# Altium footprint library MinervaBots.PcbLib: 162 footprints (part 1 of 11)
Each footprint in its own frame and in the unit in brackets; x right, y up, seen from the top. Pads: shape width x height; smd on the part's side, far side on the other; paste and mask are expansions set on the pad; w line width, h text height; cw(c..) or ccw(c..) is an arc to the next point about the centre after c.
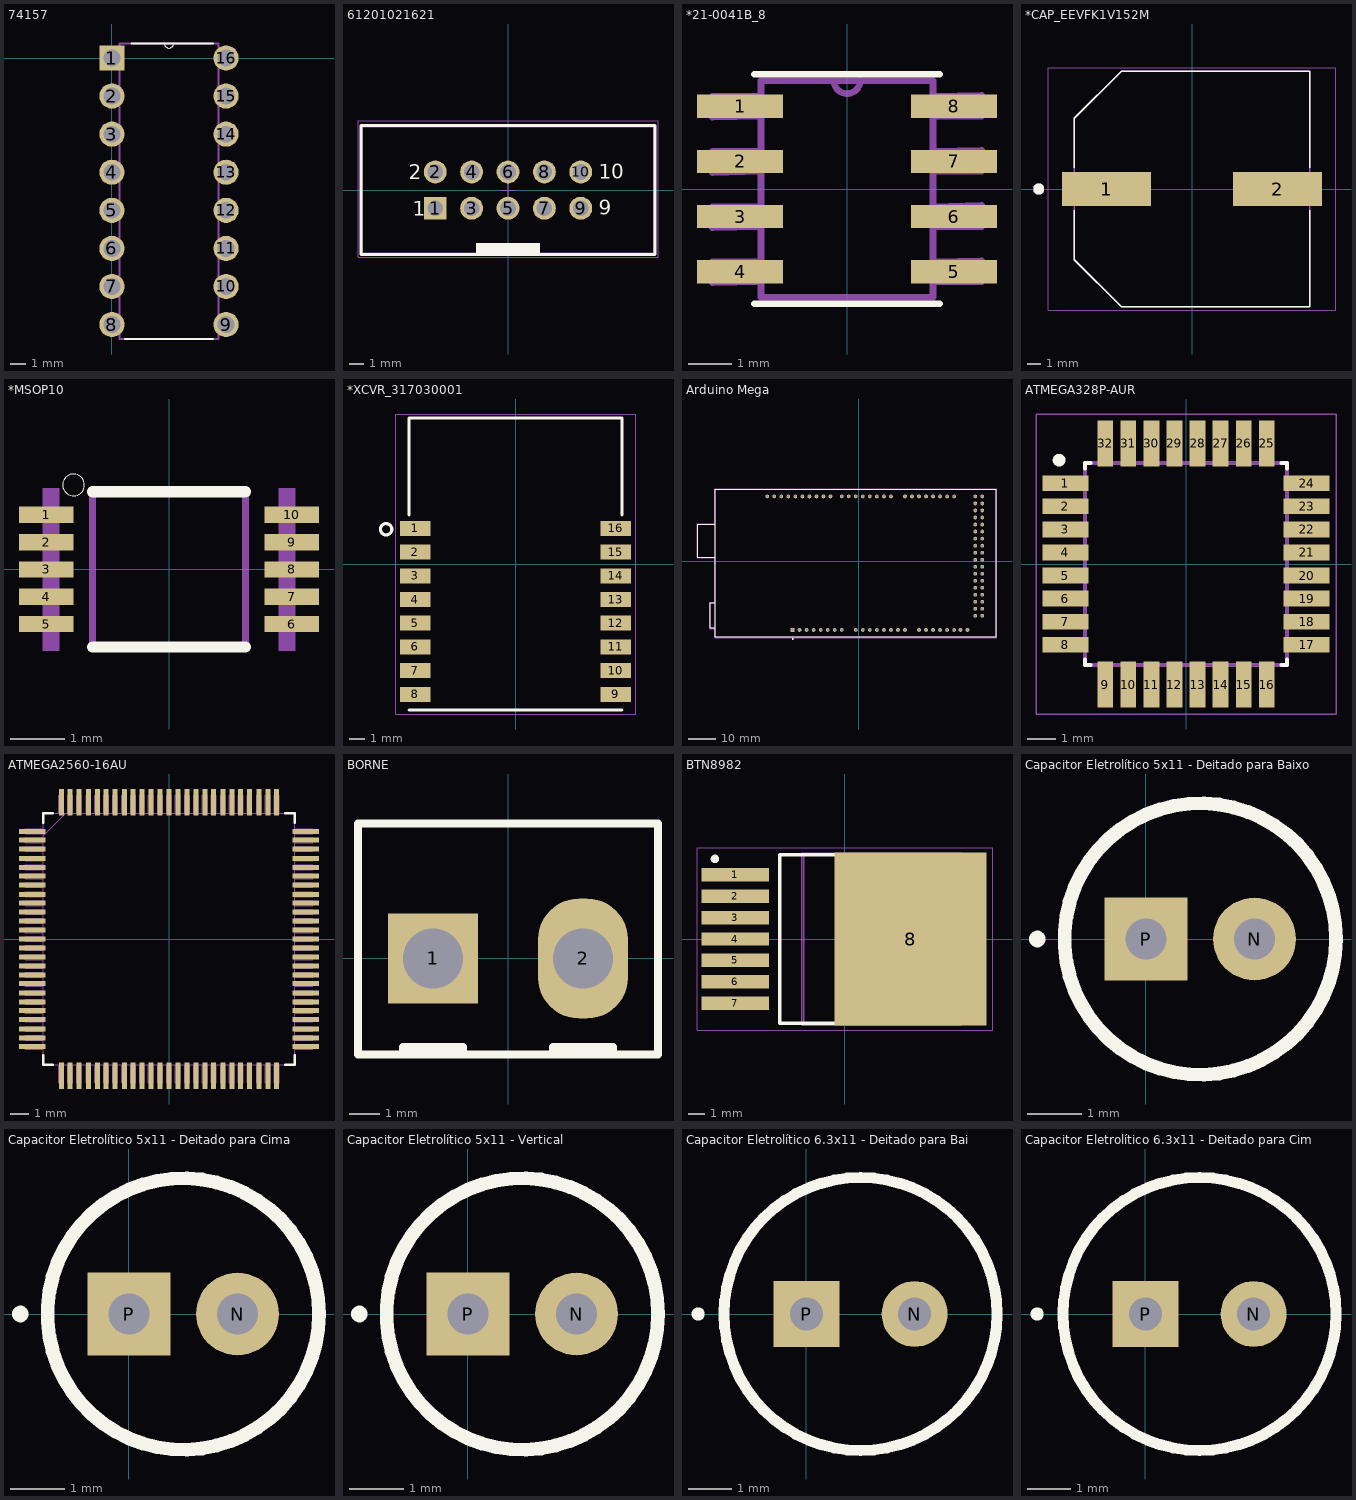
[diagram p0: the footprints below, top view; thin cyan lines are the x and y axes]

## 74157 [mil]
pads (16):
  rect 66x66 hole 44: 1(0,0)
  round 66 hole 44: 2(0,-100) 3(0,-200) 4(0,-300) 5(0,-400) 6(0,-500) 7(0,-600) 8(0,-700) 9(300,-700) 10(300,-600) 11(300,-500) 12(300,-400) 13(300,-300) 14(300,-200) 15(300,-100) 16(300,0)
Top Overlay:
  lines w0: 138,38 ccw(c150,38) 162,38
  lines w6: 35,-738 265,-738 ; 52,38 138,38 162,38 265,38
Top Designator:
  text ".Designator" at -149.9,-374.99 h60
Mechanical 4:
  lines w0: 138,38 ccw(c150,38) 162,38 cw(c150,38) 138,38
  lines w6: -22,-722 20,-722 ; -22,-722 -22,-678 ; -22,-722 20,-722 ; -22,-722 -22,-678 ; -22,-678 20,-678 ; -22,-678 20,-678 ; -22,-622 20,-622 ; -22,-622 -22,-578 ; -22,-622 20,-622 ; -22,-622 -22,-578 ; -22,-578 20,-578 ; -22,-578 20,-578 ; -22,-522 20,-522 ; -22,-522 -22,-478 ; -22,-522 20,-522 ; -22,-522 -22,-478 ; -22,-478 20,-478 ; -22,-478 20,-478 ; -22,-422 20,-422 ; -22,-422 -22,-378 ; -22,-422 20,-422 ; -22,-422 -22,-378 ; -22,-378 20,-378 ; -22,-378 20,-378 ; -22,-322 20,-322 ; -22,-322 -22,-278 ; -22,-322 20,-322 ; -22,-322 -22,-278 ; -22,-278 20,-278 ; -22,-278 20,-278 ; -22,-222 20,-222 ; -22,-222 -22,-178 ; -22,-222 20,-222 ; -22,-222 -22,-178 ; -22,-178 20,-178 ; -22,-178 20,-178 ; -22,-122 20,-122 ; -22,-122 -22,-78 ; -22,-122 20,-122 ; -22,-122 -22,-78 ; -22,-78 20,-78 ; -22,-78 20,-78 ; -22,-22 20,-22 ; -22,-22 -22,22 ; -22,-22 20,-22 ; -22,-22 -22,22 ; -22,22 20,22 ; -22,22 20,22 ; 20,-738 20,38 ; 20,-738 280,-738 ; 20,-738 20,38 ; 20,-738 280,-738 ; 20,-722 20,-678 ; 20,-722 20,-678 ; 20,-622 20,-578 ; 20,-622 20,-578 ; 20,-522 20,-478 ; 20,-522 20,-478 ; 20,-422 20,-378 ; 20,-422 20,-378 ; 20,-322 20,-278 ; 20,-322 20,-278 ; 20,-222 20,-178 ; 20,-222 20,-178 ; 20,-122 20,-78 ; 20,-122 20,-78 ; 20,-22 20,22 ; 20,-22 20,22 ; 20,38 138,38 ; 20,38 138,38 ; 138,38 162,38 ; 138,38 162,38 ; 162,38 280,38 ; 162,38 280,38 ; 280,-738 280,38 ; 280,-738 280,38 ; 280,-722 322,-722 ; 280,-722 280,-678 ; 280,-722 322,-722 ; 280,-722 280,-678 ; 280,-678 322,-678 ; 280,-678 322,-678 ; 280,-622 322,-622 ; 280,-622 280,-578 ; 280,-622 322,-622 ; 280,-622 280,-578 ; 280,-578 322,-578 ; 280,-578 322,-578 ; 280,-522 322,-522 ; 280,-522 280,-478 ; 280,-522 322,-522 ; 280,-522 280,-478 ; 280,-478 322,-478 ; 280,-478 322,-478 ; 280,-422 322,-422 ; 280,-422 280,-378 ; 280,-422 322,-422 ; 280,-422 280,-378 ; 280,-378 322,-378 ; 280,-378 322,-378 ; 280,-322 322,-322 ; 280,-322 280,-278 ; 280,-322 322,-322 ; 280,-322 280,-278 ; 280,-278 322,-278 ; 280,-278 322,-278 ; 280,-222 322,-222 ; 280,-222 280,-178 ; 280,-222 322,-222 ; 280,-222 280,-178 ; 280,-178 322,-178 ; 280,-178 322,-178 ; 280,-122 322,-122 ; 280,-122 280,-78 ; 280,-122 322,-122 ; 280,-122 280,-78 ; 280,-78 322,-78 ; 280,-78 322,-78 ; 280,-22 322,-22 ; 280,-22 280,22 ; 280,-22 322,-22 ; 280,-22 280,22 ; 280,22 322,22 ; 280,22 322,22 ; 322,-722 322,-678 ; 322,-722 322,-678 ; 322,-622 322,-578 ; 322,-622 322,-578 ; 322,-522 322,-478 ; 322,-522 322,-478 ; 322,-422 322,-378 ; 322,-422 322,-378 ; 322,-322 322,-278 ; 322,-322 322,-278 ; 322,-222 322,-178 ; 322,-222 322,-178 ; 322,-122 322,-78 ; 322,-122 322,-78 ; 322,-22 322,22 ; 322,-22 322,22
3D body "74157.step": height 165, standoff -101, extent 0,-780 310,70

## 61201021621 [mm] "10 pins, straight, gold plating"
height 9.1
pads (10):
  rect 1.6x1.6 hole 1.1: 1(-5.08,-1.27)
  round 1.6 hole 1.1: 2(-5.08,1.27) 3(-2.54,-1.27) 4(-2.54,1.27) 5(0,-1.27) 6(0,1.27) 7(2.54,-1.27) 8(2.54,1.27) 9(5.08,-1.27) 10(5.08,1.27)
Top Overlay:
  rectangle: -2.25,-4.5 2.25,-3.7
  lines w0.2: -10.28,-4.5 -10.28,4.5 10.28,4.5 10.28,-4.5 -10.28,-4.5
  text "9" at 6.34,-1.74 h1.02
  text "10" at 6.34,0.8 h1.02
  text "2" at -6.94,0.74 h1.02
  text "1" at -6.64,-1.8 h1.02
Top Designator:
  text ".Designator" at -7.618,-0.433 h1.52
Mechanical 13:
  rectangle: -2.25,-4.425 2.25,-3.7
  lines w0.1: -10.18,-4.425 10.18,-4.425 10.18,4.425 -10.18,4.425 -10.18,-4.425
Mechanical 15:
  lines w0.05: -0.5,0 0.5,0 ; 0,-0.5 0,0.5 ; -10.48,-4.7 -10.48,4.85 10.48,4.85 10.48,-4.7 -10.48,-4.7
3D body "61201021621.stp": height 9.13, standoff -2.98, extent -10.18,-4.425 10.18,4.75

## *21-0041B_8 [mil]
pads (8):
  rect 78x21 smd: 1(-97,75) 2(-97,25) 3(-97,-25) 4(-97,-75) 5(97,-75) 6(97,-25) 7(97,25) 8(97,75)
Top Overlay:
  lines w6: -84,-104 84,-104 ; -84,104 84,104
Top Designator:
  text ".Designator" at -299.9,-19.99 h60
Mechanical 4:
  lines w6: -122,-85 -122,-66 ; -122,-85 -78,-84 ; -122,-85 -122,-66 ; -122,-85 -78,-84 ; -122,-66 -78,-66 ; -122,-66 -78,-66 ; -122,-35 -122,-16 ; -122,-35 -78,-34 ; -122,-35 -122,-16 ; -122,-35 -78,-34 ; -122,-16 -78,-16 ; -122,-16 -78,-16 ; -122,15 -122,34 ; -122,15 -78,16 ; -122,15 -122,34 ; -122,15 -78,16 ; -122,34 -78,34 ; -122,34 -78,34 ; -122,65 -122,84 ; -122,65 -78,66 ; -122,65 -122,84 ; -122,65 -78,66 ; -122,84 -78,84 ; -122,84 -78,84 ; -78,-98 78,-98 ; -78,-98 -78,98 ; -78,-98 78,-98 ; -78,-98 -78,98 ; -78,-84 -78,-66 ; -78,-84 -78,-66 ; -78,-34 -78,-16 ; -78,-34 -78,-16 ; -78,16 -78,34 ; -78,16 -78,34 ; -78,66 -78,84 ; -78,66 -78,84 ; -78,98 -12,98 ; -78,98 -12,98 ; -12,98 78,98 ; -12,98 78,98 ; 78,-98 78,98 ; 78,-98 78,98 ; 78,-84 78,-66 ; 78,-84 122,-84 ; 78,-84 78,-66 ; 78,-84 122,-84 ; 78,-66 122,-65 ; 78,-66 122,-65 ; 78,-34 78,-16 ; 78,-34 122,-34 ; 78,-34 78,-16 ; 78,-34 122,-34 ; 78,-16 122,-15 ; 78,-16 122,-15 ; 78,16 78,34 ; 78,16 122,16 ; 78,16 78,34 ; 78,16 122,16 ; 78,34 122,35 ; 78,34 122,35 ; 78,66 78,84 ; 78,66 122,66 ; 78,66 78,84 ; 78,66 122,66 ; 78,84 122,85 ; 78,84 122,85 ; 122,-84 122,-65 ; 122,-84 122,-65 ; 122,-34 122,-15 ; 122,-34 122,-15 ; 122,16 122,35 ; 122,16 122,35 ; 122,66 122,85 ; 122,66 122,85 ; -12,98.08 ccw(c0,98.5) 12,98.92 cw(c0,98.5) -12,98.08

## *CAP_EEVFK1V152M [mm]
pads (2):
  rect 6.5x2.5 smd: 1(-6.25,0) 2(6.25,0)
Top Overlay:
  circle w0.4: c-11.2,0 r0.2
  lines w0.127: -8.6,-1.57 -8.6,-5.16 -5.16,-8.6 8.6,-8.6 8.6,-1.57 ; -8.6,1.57 -8.6,5.16 -5.16,8.6 8.6,8.6 8.6,1.57
Top Designator:
  text ".Designator" at -8.15,-0.508 h1.52
Mechanical 4:
  circle w0.4: c-11.2,0 r0.2
  circle w0.4: c-11.2,0 r0.2
  lines w0.127: -8.6,-5.16 -8.6,5.16 ; -8.6,-5.16 -5.16,-8.6 ; -8.6,-5.16 -8.6,5.16 ; -8.6,-5.16 -5.16,-8.6 ; -8.6,5.16 -5.16,8.6 ; -8.6,5.16 -5.16,8.6 ; -5.16,-8.6 8.6,-8.6 ; -5.16,-8.6 8.6,-8.6 ; -5.16,8.6 8.6,8.6 ; -5.16,8.6 8.6,8.6 ; 8.6,-8.6 8.6,8.6 ; 8.6,-8.6 8.6,8.6
Mechanical 16:
  lines w0.05: -10.51,-8.85 10.51,-8.85 10.51,8.85 -10.51,8.85 -10.51,-8.85
3D body "User Library-E-CAP 1500UF_SUNCON.step": height 17.2, standoff 0, extent -8.65,-8.15 8.65,8.15

## *MSOP10 [mm]
pads (10):
  rect 1x0.3 smd: 1(-2.25,1) 2(-2.25,0.5) 3(-2.25,0) 4(-2.25,-0.5) 5(-2.25,-1) 6(2.25,-1) 7(2.25,-0.5) 8(2.25,0) 9(2.25,0.5) 10(2.25,1)
Top Overlay:
  circle w0: c-1.75,1.55 r0.2
  lines w0.203: -1.4,-1.425 1.4,-1.425 ; -1.4,1.425 1.4,1.425
Top Paste:
  region: 2.137,1.438 2.388,1.438 2.388,0.563 2.137,0.563
  region: 2.137,0.937 2.388,0.937 2.388,0.062 2.137,0.062
  region: 2.137,0.437 2.388,0.437 2.388,-0.437 2.137,-0.437
  region: 2.137,-0.062 2.388,-0.062 2.388,-0.937 2.137,-0.937
  region: 2.137,-0.563 2.388,-0.563 2.388,-1.438 2.137,-1.438
  region: -2.388,-0.563 -2.137,-0.563 -2.137,-1.438 -2.388,-1.438
  region: -2.388,-0.062 -2.137,-0.062 -2.137,-0.937 -2.388,-0.937
  region: -2.388,0.437 -2.137,0.437 -2.137,-0.437 -2.388,-0.437
  region: -2.388,0.937 -2.137,0.937 -2.137,0.062 -2.388,0.062
  region: -2.388,1.438 -2.137,1.438 -2.137,0.563 -2.388,0.563
Top Solder:
  region: 2.05,1.55 2.45,1.55 2.45,0.45 2.05,0.45
  region: 2.05,1.05 2.45,1.05 2.45,-0.05 2.05,-0.05
  region: 2.05,0.55 2.45,0.55 2.45,-0.55 2.05,-0.55
  region: 2.05,0.05 2.45,0.05 2.45,-1.05 2.05,-1.05
  region: 2.05,-0.45 2.45,-0.45 2.45,-1.55 2.05,-1.55
  region: -2.45,-0.45 -2.05,-0.45 -2.05,-1.55 -2.45,-1.55
  region: -2.45,0.05 -2.05,0.05 -2.05,-1.05 -2.45,-1.05
  region: -2.45,0.55 -2.05,0.55 -2.05,-0.55 -2.45,-0.55
  region: -2.45,1.05 -2.05,1.05 -2.05,-0.05 -2.45,-0.05
  region: -2.45,1.55 -2.05,1.55 -2.05,0.45 -2.45,0.45
Top Designator:
  text ".Designator" at -7.618,-0.408 h1.52
Mechanical 4:
  region: 2.013,1.488 2.312,1.488 2.312,0.513 2.013,0.513
  region: 2.013,0.988 2.312,0.988 2.312,0.012 2.013,0.012
  region: 2.013,0.487 2.312,0.487 2.312,-0.487 2.013,-0.487
  region: 2.013,-0.012 2.312,-0.012 2.312,-0.988 2.013,-0.988
  region: 2.013,-0.513 2.312,-0.513 2.312,-1.488 2.013,-1.488
  region: -2.312,-0.513 -2.013,-0.513 -2.013,-1.488 -2.312,-1.488
  region: -2.312,-0.012 -2.013,-0.012 -2.013,-0.988 -2.312,-0.988
  region: -2.312,0.487 -2.013,0.487 -2.013,-0.487 -2.312,-0.487
  region: -2.312,0.988 -2.013,0.988 -2.013,0.012 -2.312,0.012
  region: -2.312,1.488 -2.013,1.488 -2.013,0.513 -2.312,0.513
  region: 2.013,1.488 2.312,1.488 2.312,0.513 2.013,0.513
  region: 2.013,0.988 2.312,0.988 2.312,0.012 2.013,0.012
  region: 2.013,0.487 2.312,0.487 2.312,-0.487 2.013,-0.487
  region: 2.013,-0.012 2.312,-0.012 2.312,-0.988 2.013,-0.988
  region: 2.013,-0.513 2.312,-0.513 2.312,-1.488 2.013,-1.488
  region: -2.312,-0.513 -2.013,-0.513 -2.013,-1.488 -2.312,-1.488
  region: -2.312,-0.012 -2.013,-0.012 -2.013,-0.988 -2.312,-0.988
  region: -2.312,0.487 -2.013,0.487 -2.013,-0.487 -2.312,-0.487
  region: -2.312,0.988 -2.013,0.988 -2.013,0.012 -2.312,0.012
  region: -2.312,1.488 -2.013,1.488 -2.013,0.513 -2.312,0.513
  lines w0.127: -1.4,-1.425 -1.4,1.425 -1.4,-1.425 ; 1.4,-1.425 1.4,1.425 1.4,-1.425

## *XCVR_317030001 [mm]
pads (16):
  rect 1.95x0.95 smd: 1(-6.35,2.25) 2(-6.35,0.75) 3(-6.35,-0.75) 4(-6.35,-2.25) 5(-6.35,-3.75) 6(-6.35,-5.25) 7(-6.35,-6.75) 8(-6.35,-8.25) 9(6.35,-8.25) 10(6.35,-6.75) 11(6.35,-5.25) 12(6.35,-3.75) 13(6.35,-2.25) 14(6.35,-0.75) 15(6.35,0.75) 16(6.35,2.25)
Top Overlay:
  circle w0.2: c-8.2,2.2 r0.361
  lines w0.2: -6.75,-9.25 6.75,-9.25 ; -6.75,3.1 -6.75,9.25 6.75,9.25 6.75,3.1
Top Designator:
  text ".Designator" at -8.135,-0.508 h1.52
Mechanical 16:
  lines w0.05: -7.6,-9.5 7.6,-9.5 7.6,9.5 -7.6,9.5 -7.6,-9.5
3D body "HM11.stp": height 1.7, standoff -0.1, extent -6.75,-9.144 6.75,9.356

## Arduino Mega [mm]
pads (92):
  round 1.358 hole 0.85: 0(11.666,23.458) 1(9.126,23.458) 2(6.586,23.458) 3(4.046,23.458) 3V3(-16.274,-24.802) 4(1.506,23.458) 5(-1.034,23.458) 5V_1(-13.734,-24.802) 5V_2(42.146,23.458) 5V_3(44.686,23.458) 6(-3.574,23.458) 7(-6.114,23.458) 8(-10.178,23.458) 9(-12.718,23.458) 10(-15.258,23.458) 11(-17.798,23.458) 12(-20.338,23.458) 13(-22.878,23.458) 14(16.746,23.458) 15(19.286,23.458) 16(21.826,23.458) 17(24.366,23.458) 18(26.906,23.458) 19(29.446,23.458) 20(31.986,23.458) 21(34.526,23.458) 22(42.146,20.918) 23(44.686,20.918) 24(42.146,18.378) 25(44.686,18.378) 26(42.146,15.838) 27(44.686,15.838) 28(42.146,13.298) 29(44.686,13.298) 30(42.146,10.758) 31(44.686,10.758) 32(42.146,8.218) 33(44.686,8.218) 34(42.146,5.678) 35(44.686,5.678) 36(42.146,3.138) 37(44.686,3.138) 38(42.146,0.598) 39(44.686,0.598) 40(42.146,-1.942) 41(44.686,-1.942) 42(42.146,-4.482) 43(44.686,-4.482) 44(42.146,-7.022) 45(44.686,-7.022) 46(42.146,-9.562) 47(44.686,-9.562) 48(42.146,-12.102) 49(44.686,-12.102) 50(42.146,-14.642) 51(44.686,-14.642) 52(42.146,-17.182) 53(44.686,-17.182) AD0(-1.034,-24.802) AD1(1.506,-24.802) AD2(4.046,-24.802) AD3(6.586,-24.802) AD4(9.126,-24.802) AD5(11.666,-24.802) AD6(14.206,-24.802) AD7(16.746,-24.802) AD8(21.826,-24.802) AD9(24.366,-24.802) AD10(26.906,-24.802) AD11(29.446,-24.802) AD12(31.986,-24.802) AD13(34.526,-24.802) AD14(36.812,-24.802) AD15(39.352,-24.802) AREF(-27.958,23.458) GND1(-11.194,-24.802) GND2(-8.654,-24.802) GND3(-25.418,23.458) GND4(42.146,-19.722) GND5(44.686,-19.722) IOREF(-21.354,-24.802) RESET(-18.814,-24.802) SCL(-33.038,23.458) SDA(-30.498,23.458) VIN(-6.114,-24.802)
  rect 1.358x1.358 hole 0.85: NC(-23.894,-24.802)
  round 0 all layers, no hole: None(-37.864,-24.802) None(-36.594,23.458) None(14.206,-19.722) None(14.206,8.218) None(38.336,23.458) None(44.686,-24.802)
Top Overlay:
  circle w0.24: c-23.844,-28.072 r0.12
  lines w0.127: -51.834,-24.042 -53.644,-24.042 -53.644,-15.05 -51.834,-15.05 ; -51.834,-24.042 -51.834,-15.05 ; -51.834,-24.042 -51.834,-27.342 49.766,-27.342 49.766,25.998 -51.834,25.998 -51.834,13.348 ; -51.834,-15.05 -51.834,1.548 ; -51.834,1.548 -58.184,1.548 -58.184,13.348 -51.834,13.348 ; -51.834,1.548 -51.834,13.348
Top Designator:
  text ".Designator" at -11.827,-1.528 h1.52
Mechanical 4:
  circle w0.24: c-23.844,-28.072 r0.12
  circle w0.24: c-23.844,-28.072 r0.12
  lines w0.127: -58.184,1.548 -51.834,1.548 ; -58.184,1.548 -58.184,13.348 ; -58.184,1.548 -51.834,1.548 ; -58.184,1.548 -58.184,13.348 ; -58.184,13.348 -51.834,13.348 ; -58.184,13.348 -51.834,13.348 ; -53.644,-24.042 -53.644,-15.05 ; -53.644,-24.042 -51.834,-24.042 ; -53.644,-24.042 -53.644,-15.05 ; -53.644,-24.042 -51.834,-24.042 ; -53.644,-15.05 -51.834,-15.05 ; -53.644,-15.05 -51.834,-15.05 ; -51.834,-27.342 49.766,-27.342 ; -51.834,-27.342 -51.834,-24.042 ; -51.834,-27.342 49.766,-27.342 ; -51.834,-27.342 -51.834,-24.042 ; -51.834,-24.042 -51.834,-15.05 ; -51.834,-24.042 -51.834,-15.05 ; -51.834,-15.05 -51.834,1.548 ; -51.834,-15.05 -51.834,1.548 ; -51.834,1.548 -51.834,13.348 ; -51.834,1.548 -51.834,13.348 ; -51.834,13.348 -51.834,25.998 ; -51.834,13.348 -51.834,25.998 ; -51.834,25.998 49.766,25.998 ; -51.834,25.998 49.766,25.998 ; 49.766,-27.342 49.766,25.998 ; 49.766,-27.342 49.766,25.998
Mechanical 16:
  lines w0.05: -58.434,1.298 -58.434,13.598 -52.084,13.598 -52.084,26.248 50.016,26.248 50.016,-27.592 -52.084,-27.592 -52.084,-24.292 -53.894,-24.292 -53.894,-14.8 -52.084,-14.8 -52.084,1.298 -58.434,1.298
3D body "Arduino MEGA 2650.STEP": height -0.95, standoff -16.2, extent -58.42,-27.305 49.53,26.035

## ATMEGA328P-AUR [mm]
pads (32):
  rect 1.6x0.55 smd: 1(-4.18,2.8) 2(-4.18,2) 3(-4.18,1.2) 4(-4.18,0.4) 5(-4.18,-0.4) 6(-4.18,-1.2) 7(-4.18,-2) 8(-4.18,-2.8) 17(4.18,-2.8) 18(4.18,-2) 19(4.18,-1.2) 20(4.18,-0.4) 21(4.18,0.4) 22(4.18,1.2) 23(4.18,2) 24(4.18,2.8)
  rect 0.55x1.6 smd: 9(-2.8,-4.18) 10(-2,-4.18) 11(-1.2,-4.18) 12(-0.4,-4.18) 13(0.4,-4.18) 14(1.2,-4.18) 15(2,-4.18) 16(2.8,-4.18) 25(2.8,4.18) 26(2,4.18) 27(1.2,4.18) 28(0.4,4.18) 29(-0.4,4.18) 30(-1.2,4.18) 31(-2,4.18) 32(-2.8,4.18)
Top Overlay:
  circle w0.24: c-4.4,3.6 r0.1
  lines w0.127: -3.5,-3.3 -3.5,-3.5 -3.3,-3.5 ; -3.5,3.3 -3.5,3.5 -3.3,3.5 ; 3.3,-3.5 3.5,-3.5 3.5,-3.3 ; 3.3,3.5 3.5,3.5 3.5,3.3
Top Designator:
  text ".Designator" at -7.618,-0.508 h1.52
Mechanical 4:
  lines w0.127: -3.5,-3.5 -3.5,3.5 ; -3.5,-3.5 3.5,-3.5 ; -3.5,-3.5 -3.5,3.5 ; -3.5,-3.5 3.5,-3.5 ; -3.5,3.5 3.5,3.5 ; -3.5,3.5 3.5,3.5 ; 3.5,-3.5 3.5,3.5 ; 3.5,-3.5 3.5,3.5
Mechanical 16:
  lines w0.05: -5.2,-5.2 -5.2,5.2 5.2,5.2 5.2,-5.2 -5.2,-5.2
3D body "ATmega_AP214.STEP": height 1, standoff -0.1, extent -4.498,-4.498 4.498,4.498

## ATMEGA2560-16AU [mil]
pads (100):
  rect 58x11 smd: 1(-300,236) 2(-300,217) 3(-300,197) 4(-300,177) 5(-300,157) 6(-300,138) 7(-300,118) 8(-300,98) 9(-300,79) 10(-300,59) 11(-300,39) 12(-300,20) 13(-300,0) 14(-300,-20) 15(-300,-39) 16(-300,-59) 17(-300,-79) 18(-300,-98) 19(-300,-118) 20(-300,-138) 21(-300,-157) 22(-300,-177) 23(-300,-197) 24(-300,-217) 25(-300,-236) 51(300,-236) 52(300,-217) 53(300,-197) 54(300,-177) 55(300,-157) 56(300,-138) 57(300,-118) 58(300,-98) 59(300,-79) 60(300,-59) 61(300,-39) 62(300,-20) 63(300,0) 64(300,20) 65(300,39) 66(300,59) 67(300,79) 68(300,98) 69(300,118) 70(300,138) 71(300,157) 72(300,177) 73(300,197) 74(300,217) 75(300,236)
  rect 11x58 smd: 26(-236,-300) 27(-217,-300) 28(-197,-300) 29(-177,-300) 30(-157,-300) 31(-138,-300) 32(-118,-300) 33(-98,-300) 34(-79,-300) 35(-59,-300) 36(-39,-300) 37(-20,-300) 38(0,-300) 39(20,-300) 40(39,-300) 41(59,-300) 42(79,-300) 43(98,-300) 44(118,-300) 45(138,-300) 46(157,-300) 47(177,-300) 48(197,-300) 49(217,-300) 50(236,-300) 76(236,300) 77(217,300) 78(197,300) 79(177,300) 80(157,300) 81(138,300) 82(118,300) 83(98,300) 84(79,300) 85(59,300) 86(39,300) 87(20,300) 88(0,300) 89(-20,300) 90(-39,300) 91(-59,300) 92(-79,300) 93(-98,300) 94(-118,300) 95(-138,300) 96(-157,300) 97(-177,300) 98(-197,300) 99(-217,300) 100(-236,300)
Top Overlay:
  lines w6: -276,-255 -276,-276 -255,-276 ; -276,255 -276,276 -255,276 ; 255,-276 276,-276 276,-255 ; 255,276 276,276 276,255
Top Designator:
  text ".Designator" at -299.9,-19.99 h60
Mechanical 4:
  drawing of 810 lines, arcs and shapes, not listed
3D body "User Library-100A-14x14.step": height 39.37, standoff -3.94, extent -314.96,-314.96 314.97,314.96

## BORNE [mm] "2 pinos"
pads (2):
  rect 3x3 hole 2: 1(-2.5,0)
  rrect90% 3x4 hole 2: 2(2.5,0)
Top Overlay:
  lines w0.254: -5,-3.2 -5,4.5 5,4.5 5,-3.2 -5,-3.2 ; -3.5,-3.2 -1.5,-3.2 -1.5,-2.95 -3.5,-2.95 -3.5,-3.2 ; 1.5,-3.2 3.5,-3.2 3.5,-2.95 1.5,-2.95 1.5,-3.2
Top Designator:
3D body "KF301-5.0-2P.step": height 10, standoff -3.6, extent -5,-3.2 5,4.5

## BTN8982 [mm]
height 4.4
pads (8):
  rect 4x0.8 smd: 1(-6.5,3.81) 2(-6.5,2.54) 3(-6.5,1.27) 4(-6.5,0) 5(-6.5,-1.27) 6(-6.5,-2.54) 7(-6.5,-3.81)
  rect 9x10.25 smd: 8(3.9,0)
Top Overlay:
  circle w0.25: c-7.7,4.75 r0.125
  lines w0.2: -0.45,-5 -3.85,-5 -3.85,5 -0.45,5
Top Paste:
  region: 0.71,-4.47 2.29,-4.47 2.29,-2.73 0.71,-2.73
  region: 3.11,-4.47 4.69,-4.47 4.69,-2.73 3.11,-2.73
  region: 5.51,-4.47 7.09,-4.47 7.09,-2.73 5.51,-2.73
  region: 0.71,-2.07 2.29,-2.07 2.29,-0.33 0.71,-0.33
  region: 3.11,-2.07 4.69,-2.07 4.69,-0.33 3.11,-0.33
  region: 5.51,-2.07 7.09,-2.07 7.09,-0.33 5.51,-0.33
  region: 0.71,0.33 2.29,0.33 2.29,2.07 0.71,2.07
  region: 3.11,0.33 4.69,0.33 4.69,2.07 3.11,2.07
  region: 5.51,0.33 7.09,0.33 7.09,2.07 5.51,2.07
  region: 0.71,2.73 2.29,2.73 2.29,4.47 0.71,4.47
  region: 3.11,2.73 4.69,2.73 4.69,4.47 3.11,4.47
  region: 5.51,2.73 7.09,2.73 7.09,4.47 5.51,4.47
Top Designator:
  text ".Designator" at -7.618,-0.508 h1.52
Mechanical 15:
  lines w0.1: 6.8,-4.85 7.031,-4.85 7.5,-4.33 7.5,4.33 7.031,4.85 6.8,4.85 ; -2.45,-5 6.8,-5 6.8,5 -2.45,5 -2.45,-5
Mechanical 16:
  circle w0.05: c0,0 r0.35
  lines w0.001: -2.55,-5.1 6.9,-5.1 6.9,5.1 -2.55,5.1 -2.55,-5.1
  lines w0.05: -0.5,0 0.5,0 ; 0,-0.5 0,0.5 ; -8.763,-5.4 8.763,-5.4 8.763,5.4 -8.763,5.4 -8.763,-5.4
3D body "SW3dPS-TO263-7-1.STEP": height 4.78, standoff -0.02, extent -7.923,-5 7.747,5

## Capacitor Eletrolítico 5x11 - Deitado para Baixo [mil]
pads (2):
  round 60 hole 30: N(78.74,0)
  rect 60x60 hole 30: P(0,0)
Top Overlay:
  circle w10: c-78.74,0 r0.98
  circle w10: c39.37,0 r98.43
Top Designator:
  text ".Designator" at -270.87,-224.21 h60
3D body "ElCapRA-2.0-5x11-black.step": height 200.77, standoff -118.11, extent -59.06,-511.85 137.83,9.82

## Capacitor Eletrolítico 5x11 - Deitado para Cima [mil]
pads (2):
  round 60 hole 30: N(78.74,0)
  rect 60x60 hole 30: P(0,0)
Top Overlay:
  circle w10: c-78.74,0 r0.98
  circle w10: c39.37,0 r98.43
Top Designator:
  text ".Designator" at -270.87,184.22 h60
3D body "ElCapLA-2.0-5x11-black.step": height 200.77, standoff -118.11, extent -59.06,-9.82 137.83,511.85

## Capacitor Eletrolítico 5x11 - Vertical [mil]
pads (2):
  round 60 hole 30: N(78.74,0)
  rect 60x60 hole 30: P(0,0)
Top Overlay:
  circle w10: c-78.74,0 r0.98
  circle w10: c39.37,0 r98.43
Top Designator:
  text ".Designator" at -270.87,-19.99 h60
3D body "ElCapVT-2.0-5x11-black.step": height 433.11, standoff -118.11, extent -59.06,-98.41 137.83,98.41

## Capacitor Eletrolítico 6.3x11 - Deitado para Baixo [mil]
pads (2):
  round 60 hole 30: N(98.43,0)
  rect 60x60 hole 30: P(0,0)
Top Overlay:
  circle w10: c49.21,0 r124.02
  circle w10: c-98.43,0 r0.98
Top Designator:
  text ".Designator" at -262.99,-211.41 h60
3D body "ElCapRA-2.5-6.3x11-black.step": height 251.87, standoff -118.11, extent -74.8,-511.85 173.27,9.82

## Capacitor Eletrolítico 6.3x11 - Deitado para Cima [mil]
pads (2):
  round 60 hole 30: N(98.43,0)
  rect 60x60 hole 30: P(0,0)
Top Overlay:
  circle w10: c-98.43,0 r0.98
  circle w10: c49.21,0 r124.02
Top Designator:
  text ".Designator" at -262.99,171.42 h60
3D body "ElCapLA-2.5-6.3x11-black.step": height 251.87, standoff -118.11, extent -74.8,-9.82 173.27,511.85